# Altium footprint library Discretes.PcbLib: 81 footprints (part 1 of 6)
Each footprint in its own frame and in the unit in brackets; x right, y up, seen from the top. Pads: shape width x height; smd on the part's side, far side on the other; paste and mask are expansions set on the pad; w line width, h text height; cw(c..) or ccw(c..) is an arc to the next point about the centre after c.
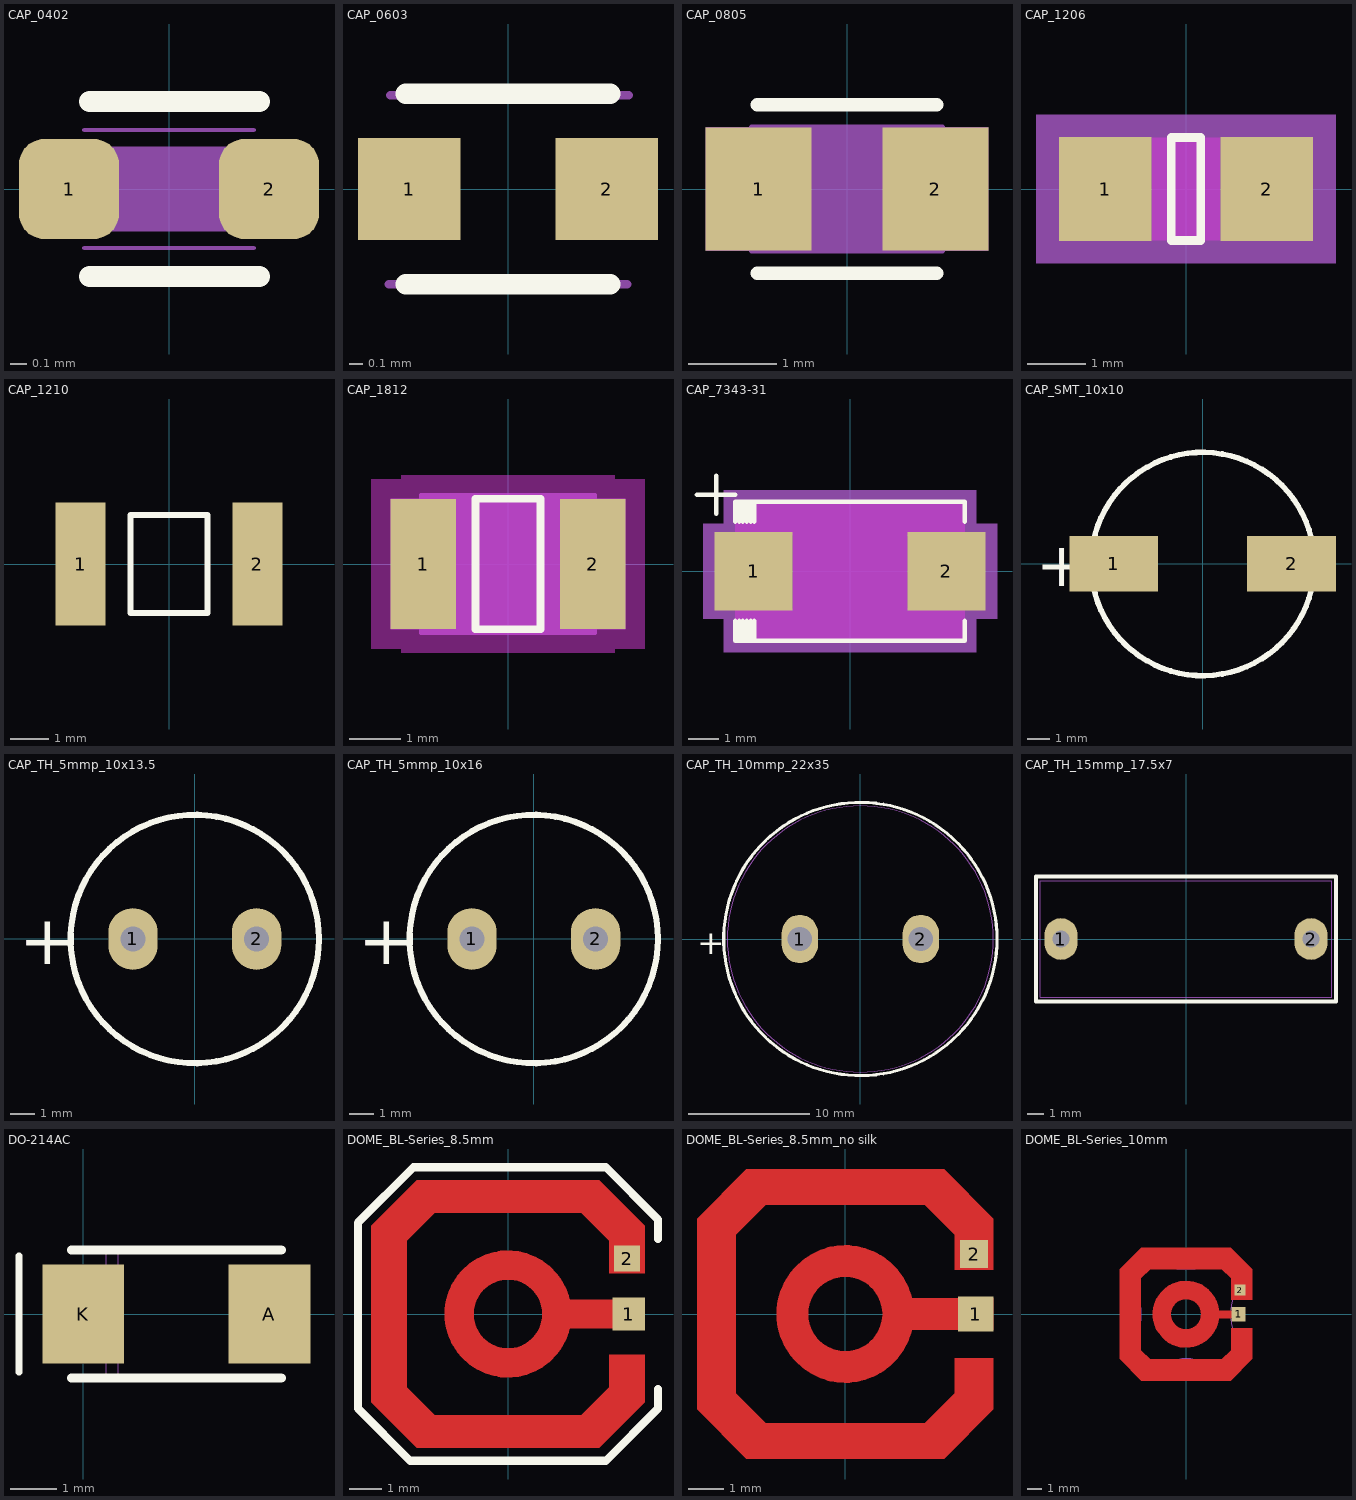
[diagram p0: the footprints below, top view; thin cyan lines are the x and y axes]

## CAP_0402 [mm] "Capacitor 0402 Package"
height 0.559
pads (2):
  rrect50% 0.6x0.6 smd: 1(-0.6,0) 2(0.6,0)
Top Overlay:
  lines w0.127: -0.475,-0.525 0.541,-0.525 ; -0.475,0.525 0.541,0.525
Mechanical 1:
  lines w0.025: -0.508,-0.354 0.508,-0.354 ; -0.508,0.354 0.508,0.354
  text ".Designator" at -0.275,-0.175 h0.38
Mechanical 11:
  pour cut-out: -0.635,0.254 0.635,0.254 0.762,0.127 0.762,-0.127 0.635,-0.254 -0.635,-0.254 -0.762,-0.127 -0.762,0.127
3D body "CAPC1005X06.step": height 0.25, standoff -0.25, extent -0.5,-0.3 0.5,0.3

## CAP_0603 [mil] "Capacitor 0603 package"
height 35
pads (2):
  rect 30x30 smd: 1(-29,0) 2(29,0)
Top Overlay:
  lines w6: -30,-28 30,-28 ; -30,28 30,28
Mechanical 1:
  lines w2.5: -35,-27.87 35,-27.87 ; -34.57,27.56 35.43,27.56
  text ".Designator" at -19.68,-19.68 h39.37
3D body "CAP0603-1.step": height 30, standoff 0, extent -29.99,-14.99 30.01,15

## CAP_0805 [mm] "Capacitor 0805 package"
height 0.78
pads (2):
  rect 1.2x1.397 smd: 1(-1,0) 2(1,0)
Top Overlay:
  lines w0.152: -1.016,-0.953 1.016,-0.953 ; -1.016,0.953 1.016,0.953
Mechanical 1:
  lines w0.064: -1.079,-0.699 1.079,-0.699 ; -1.079,0.699 1.079,0.699
  text ".Designator" at -0.6,-0.4 h0.89
Mechanical 11:
  pour cut-out: -1.6,-0.699 1.6,-0.699 1.6,0.699 -1.6,0.699
3D body "0805 SMD Capacitor.step": height 0.78, standoff 0, extent -1,-0.625 1,0.625

## CAP_1206 [mil] "Capacitor 1206package"
height 53
pads (2):
  rect 63x71 smd: 1(-55,0) 2(55,0)
Top Overlay:
  lines w6: -10,-35 10,-35 10,35 -10,35 -10,-35
Mechanical 1:
  lines w2.5: -67,-35.5 67,-35.5 ; -67,35.5 67,35.5
  text ".Designator" at -37.2,-15 h35
Mechanical 11:
  pour cut-out: -67,-35.5 67,-35.5 87,-35.5 87,35.5 67,35.5 -67,35.5 -87,35.5 -87,-35.5
Mechanical 13:
  pour cut-out: -102,-50.5 102,-50.5 102,50.5 -102,50.5
Mechanical 29 keep-out:
  region: -20,35 -20,-35 20,-35 20,35
  region: 23,-35 23,35 -23,35 -23,-35
Mechanical 31:
  lines w1: -25,0 25,0 ; 0,-25 0,25
3D body "1206 SMD Capacitor.step": height 39.45, standoff 0, extent -62.99,-31.5 62.99,31.5

## CAP_1210 [mm]
height 1.778
pads (2):
  rect 1.3x3.2 smd: 1(-2.3,0) 2(2.3,0)
Top Overlay:
  lines w0.152: -1,-1.27 -1,1.27 1,1.27 1,-1.27 -1,-1.27
Mechanical 1:
  text ".Designator" at -1.25,-3.25 h1.27
3D body "CAPC4532X10.step": height 1, standoff 0, extent -2.25,-1.6 2.25,1.6

## CAP_1812 [mil]
height 70
pads (2):
  rect 50x100 smd: 1(-65,0) 2(65,0)
Top Overlay:
  lines w6: -25,-50 25,-50 25,50 -25,50 -25,-50
Keep-Out Layer:
  pour cut-out: -82,-68 -82,-65 -105,-65 -105,65 -82,65 -82,68 82,68 82,65 105,65 105,-65 82,-65 82,-68
Mechanical 1:
  lines w2.5: -67,-53 -67,53 67,53 67,-53 -67,-53
  text ".Designator" at -49.21,-127.95 h50
Mechanical 11:
  pour cut-out: -90,-50 -67,-50 -67,-53 67,-53 67,-50 90,-50 90,50 67,50 67,53 -67,53 -67,50 -90,50
Mechanical 29 keep-out:
  region: -40,50 -40,-50 40,-50 40,50
3D body "CAPC3225X10.step": height 39.37, standoff 0, extent -62.98,-49.2 63,49.22

## CAP_7343-31 [mil] "Cap Tantalum 7343 (2917)"
height 122
pads (2):
  rect 102x102 smd: 1(-126,0) 2(126,0)
Top Overlay:
  lines w6: -200,100 -150,100 ; -175,75 -175,125 ; -150,-91 150,-91 ; -150,-90 -150,-65 ; -150,65 -150,90 ; -150,91 150,91 ; -145,-90 -145,-65 ; -145,65 -145,90 ; -140,-90 -140,-65 ; -140,65 -140,90 ; -135,-90 -135,-65 ; -135,65 -135,90 ; -130,-90 -130,-65 ; -130,65 -130,90 ; -125,-90 -125,-65 ; -125,65 -125,90 ; 150,-90 150,-65 ; 150,65 150,90
Mechanical 1:
  lines w2: -200,100 -150,100 ; -175,75 -175,125 ; -150,-91 150,-91 150,91 -100,91 -150,41 -150,-91
  text ".Designator" at -63,0 h50
Mechanical 11:
  pour cut-out: -150,-91 150,-91 150,-51 177,-51 177,51 150,51 150,91 -150,91 -150,51 -177,51 -177,-51 -150,-51
Mechanical 15:
  pour cut-out: -165,-106 -165,-62 -192,-62 -192,62 -165,62 -165,106 165,106 165,62 192,62 192,-62 165,-62 165,-106
Mechanical 29 keep-out:
  region: -150,-91 150,-91 150,-48 75,-48 75,47 150,47 150,91 -150,91 -150,47 -74,47 -74,-49 -150,-49
  region: 74,-91 74,91 -73,91 -73,-91
3D body "CAP_TANT_7343-40.step": height 157.48, standoff 0, extent -149.6,-90.55 149.61,90.55

## CAP_SMT_10x10 [mm] "SMT Radial 10mm dia"
height 13.5
pads (2):
  rect 4x2.5 smd: 1(-4,0) 2(4,0)
Top Overlay:
  circle w0.25: c0,-0.002 r5.025
  text "+" at -7.5,-1 h2
Mechanical 1:
  circle w0.025: c0,-0.002 r5.025
  text "+" at -4.826,-1.016 h2
  text ".Designator" at -1.016,-0.254 h1
3D body "CAP_AL-10x10_5.step": height 10.8, standoff 0, extent -5.65,-5.15 5.65,5.15

## CAP_TH_5mmp_10x13.5 [mm] "Through Hole Part, 2pin, 0.5mm dia, 5mmP"
height 13.5
pads (2):
  oval 2x2.5 hole 1: 1(-2.5,0) 2(2.5,0)
Top Overlay:
  circle w0.25: c0,-0.002 r5.025
  text "+" at -7.112,-1.016 h2
Mechanical 1:
  circle w0.025: c0,-0.002 r5.025
  circle w0.025: c2.5,0 r0.35
  circle w0.025: c-2.5,0 r0.35
  circle w0.025: c-2.5,0 r0.35
  text "+" at -4.826,-1.016 h2
  text ".Designator" at -1.016,-0.254 h1
3D body: height 0, standoff -2, extent 2.2,-0.3 2.8,0.3
3D body: height 0, standoff -2, extent -2.8,-0.3 -2.2,0.3
3D body: height 13.5, standoff 0, extent -5,-5 5,5

## CAP_TH_5mmp_10x16 [mm] "Through Hole Part, 2pin, 0.5mm dia, 5mmP"
pads (2):
  oval 2x2.5 hole 1: 1(-2.5,0) 2(2.5,0)
Top Overlay:
  circle w0.25: c0,-0.002 r5.025
  text "+" at -7.112,-1.016 h2
Mechanical 1:
  circle w0.025: c-2.5,0 r0.35
  circle w0.025: c-2.5,0 r0.35
  circle w0.025: c2.5,0 r0.35
  circle w0.025: c0,-0.002 r5.025
  text ".Designator" at -1.016,-0.254 h1
  text "+" at -4.826,-1.016 h2
3D body "Cap electro 10x16x5_0mm.step": height 16.28, standoff -3.99, extent -5.025,-5.027 5.026,5.024

## CAP_TH_10mmp_22x35 [mm] "Through Hole Part, 2pin, 0.8mm dia, 10mmP"
height 35
pads (2):
  oval 3x4 hole 2: 1(-5,0) 2(5,0)
Top Overlay:
  circle w0.254: c0,0 r11.294
  text "+" at -13.5,-1.25 h2
Mechanical 1:
  circle w0.025: c-5,0 r0.35
  circle w0.025: c0,0 r10.996
  circle w0.025: c-5,0 r0.75
  circle w0.025: c5,0 r0.75
  text "+" at -9.826,-1.016 h2
  text ".Designator" at -1.75,-0.5 h1
3D body: height 35, standoff 0, extent -11,-10.995 11,10.996
3D body: height 0, standoff -2, extent -5.8,-0.8 -4.2,0.8
3D body: height 0, standoff -2, extent 4.2,-0.8 5.8,0.8

## CAP_TH_15mmp_17.5x7 [mm] "Through Hole Part, 2pin, 0.5mm dia, 15mmP"
pads (2):
  oval 2x2.5 hole 1: 1(-7.5,0) 2(7.5,0)
Top Overlay:
  lines w0.254: -9,-3.75 -9,3.75 9,3.75 9,-3.75 -9,-3.75
Mechanical 1:
  circle w0.025: c7.5,0 r0.4
  circle w0.025: c-7.5,0 r0.4
  lines w0.025: -8.75,-3.5 8.75,-3.5 8.75,3.5 -8.75,3.5 -8.75,0 -8.75,-3.5
  text ".Designator" at -3.3,-0.3 h1
3D body: height 0, standoff -2, extent 7.1,-0.4 7.9,0.4
3D body: height 12.5, standoff 0, extent -8.75,-3.5 8.75,3.5
3D body: height 0, standoff -2, extent -7.9,-0.4 -7.1,0.4

## DO-214AC [mil] "Diode smd - HSMA - DO-241AC"
height 116
pads (2):
  rect 70x85 smd: A(160,0) K(0,0)
Top Overlay:
  lines w6: -55,-50 -55,50
  lines w8: -10,-55 170,-55 ; -10,55 170,55
Mechanical 1:
  lines w1: -10,-55 170,-55 ; -10,55 170,55 ; 20,-55 20,55 ; 30,-55 30,55
  text ".Designator" at 41,-32 h60
Mechanical 13:
  lines w1: 20,-55 30,-55 ; 20,55 30,55
3D body "DO-214AC(SMA).step": height 90, standoff 0, extent -22.99,-55.99 193.01,54.01

## DOME_BL-Series_8.5mm [mm] "Tactile Dome Switch wLED Hole 8.5mm"
height 0.56
pads (2):
  rect 1x1 smd paste-1: 1(3.7,0)
  rect 0.8x0.8 smd paste-0.8 mask-0.8: 2(3.65,1.7)
Top Layer:
  circle w0.9: c0,0 r1.5
  rectangle: 1.7,-0.45 4.2,0.45
  region: 3.1,1.25 4.2,1.25 4.2,2.7 2.8,4.1 -2.8,4.1 -4.2,2.7 -4.2,-2.7 -2.8,-4.1 2.8,-4.1 4.2,-2.7 4.2,-1.25 3.1,-1.25 3.1,-2.25 2.25,-3.1 -2.25,-3.1 -3.1,-2.25 -3.1,2.25 -2.25,3.1 2.25,3.1 3.1,2.25
Top Overlay:
  lines w0.25: 4.6,-2.3 4.6,-2.9 3,-4.5 -3,-4.5 -4.6,-2.9 -4.6,2.8 -2.9,4.5 3,4.5 4.6,2.9 4.6,2.3
Top Solder:
  region: 4.3,0.6 1.9,0.6 1.9,-0.6 4.3,-0.6
Mechanical 1:
  text ".Designator" at -1.575,4.75 h1.52
3D body "DOME-BL08260.STEP": height 0.51, standoff 0, extent -3.561,-3.561 3.561,3.561

## DOME_BL-Series_8.5mm_no silk [mm] "Tactile Dome Switch wLED Hole 8.5mm"
height 0.56
pads (2):
  rect 1x1 smd paste-1: 1(3.7,0)
  rect 0.8x0.8 smd paste-0.8 mask-0.8: 2(3.65,1.7)
Top Layer:
  circle w0.9: c0,0 r1.5
  rectangle: 1.7,-0.45 4.2,0.45
  region: 3.1,1.25 4.2,1.25 4.2,2.7 2.8,4.1 -2.8,4.1 -4.2,2.7 -4.2,-2.7 -2.8,-4.1 2.8,-4.1 4.2,-2.7 4.2,-1.25 3.1,-1.25 3.1,-2.25 2.25,-3.1 -2.25,-3.1 -3.1,-2.25 -3.1,2.25 -2.25,3.1 2.25,3.1 3.1,2.25
Top Solder:
  region: 4.3,0.6 1.9,0.6 1.9,-0.6 4.3,-0.6
Mechanical 1:
  text ".Designator" at -1.575,4.75 h1.52
3D body "DOME-BL08260.STEP": height 0.51, standoff 0, extent -3.561,-3.561 3.561,3.561

## DOME_BL-Series_10mm [mm] "Tactile Dome Switch wLED Hole 10mm"
height 0.56
pads (2):
  rect 1x1 smd paste-1: 1(3.7,0)
  rect 0.8x0.8 smd paste-0.8 mask-0.8: 2(3.8,1.7)
Top Layer:
  circle w1.3: c0,0 r1.7
  rectangle: 2.1,-0.3 3.6,0.25
  region: -3.15,-4.67 -4.67,-3.15 -4.67,3.15 -3.15,4.67 3.15,4.67 4.67,3.15 4.67,1 3.17,1 3.17,2.529 2.529,3.17 -2.529,3.17 -3.17,2.529 -3.17,-2.529 -2.529,-3.17 2.529,-3.17 3.17,-2.529 3.17,-1 4.67,-1 4.67,-3.15 3.15,-4.67
Top Solder:
  circle w4: c0,0 r0.5
  region: 4.3,0.6 1.9,0.6 1.9,-0.6 4.3,-0.6
Mechanical 1:
  circle w0.025: c0,0 r1.27
  lines w0.025: -4.21,-2.609 ccw(c-6.819,0) -4.21,2.609 -2.625,4.223 ccw(c0,6.848) 2.625,4.223 4.21,2.609 ccw(c6.819,0) 4.21,-2.609 2.625,-4.224 ccw(c0.001,-6.834) -2.609,-4.21 -4.21,-2.609
  text ".Designator" at -2.7,5.4 h1.52
3D body "DOME-BL10280.STEP": height 0.57, standoff 0, extent -4.223,-4.223 4.224,4.224